# Altium footprint library Connectors.PcbLib: 155 footprints (part 6 of 10)
Each footprint in its own frame and in the unit in brackets; x right, y up, seen from the top. Pads: shape width x height; smd on the part's side, far side on the other; paste and mask are expansions set on the pad; w line width, h text height; cw(c..) or ccw(c..) is an arc to the next point about the centre after c.
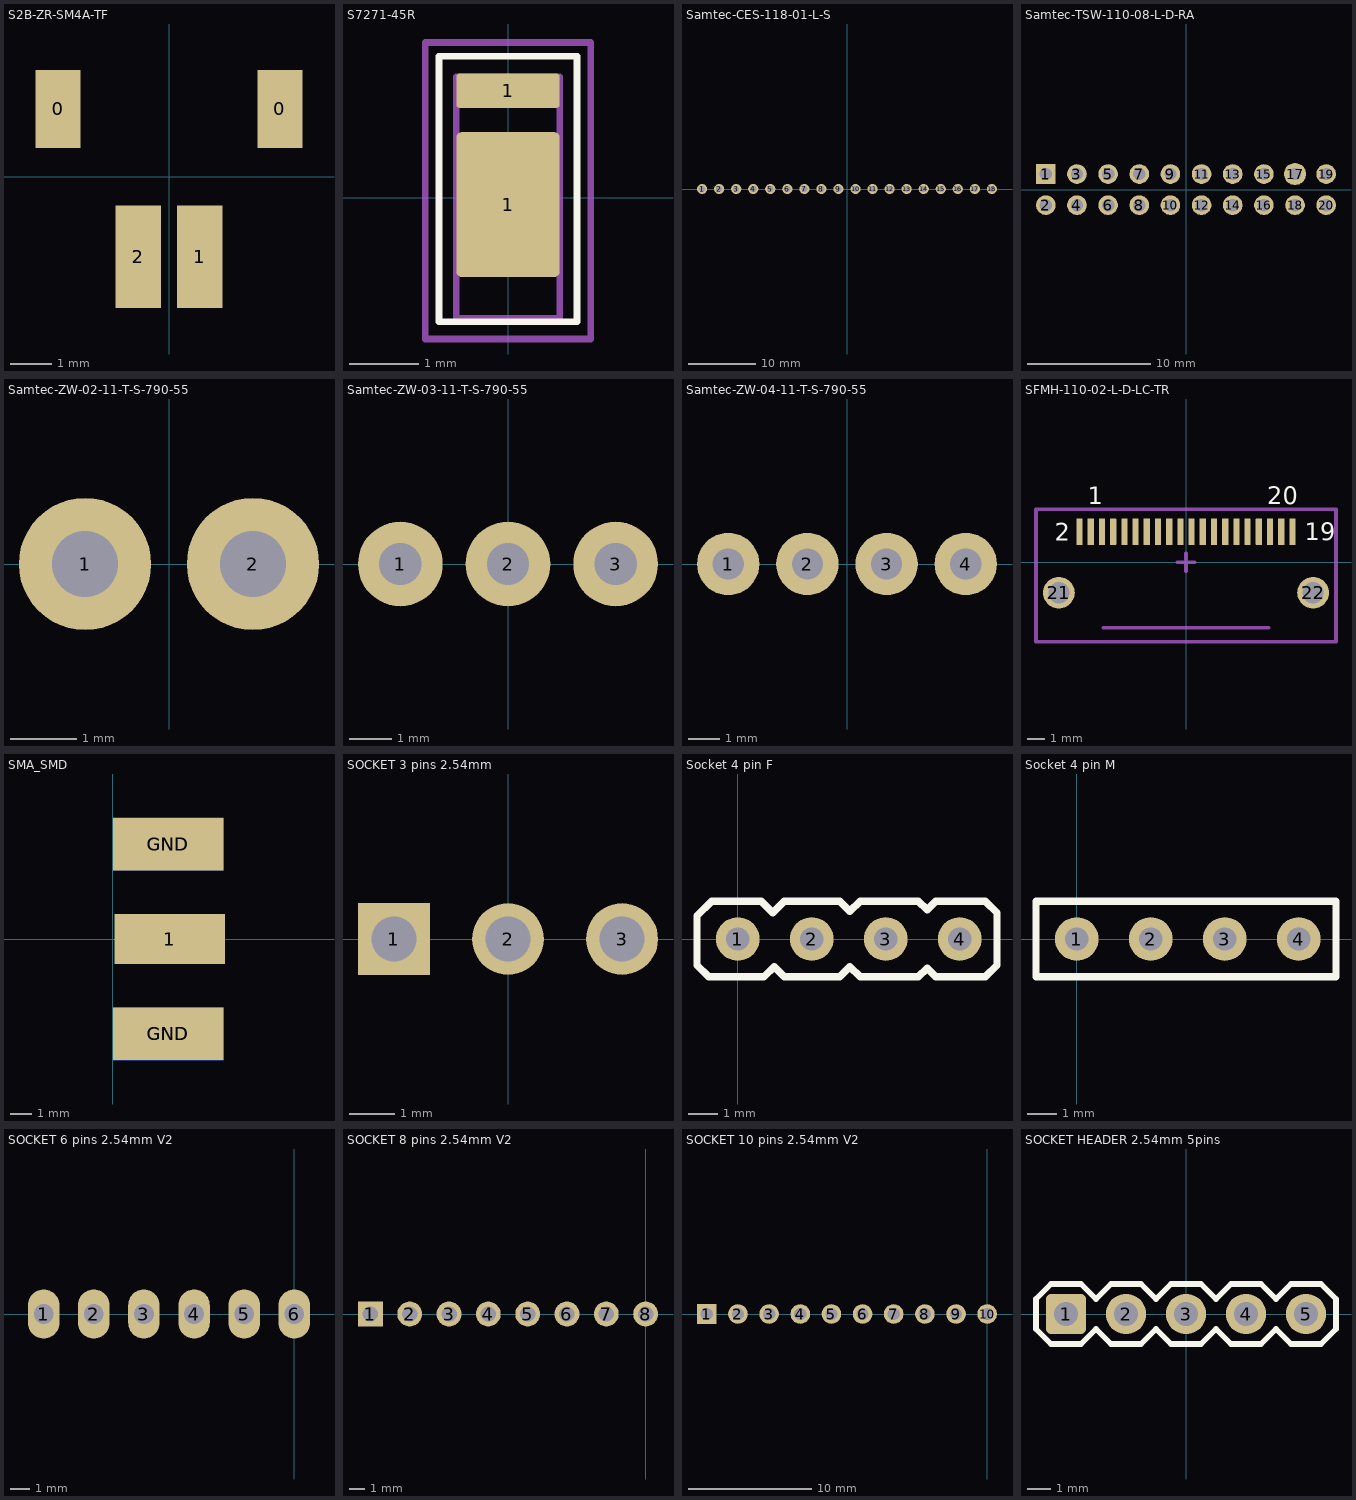
[diagram p5: the footprints below, top view; thin cyan lines are the x and y axes]

## S2B-ZR-SM4A-TF [mm]
pads (4):
  rect 1.1x1.9 smd: 0(-2.7,1.65) 0(2.7,1.65)
  rect 1.1x2.5 smd: 1(0.75,-1.95) 2(-0.75,-1.95)
3D body: height 3.7, standoff 0, extent -3,-2.9 3,3.6

## S7271-45R [mm] "Harwin S7271-45R"
height 2
pads (2):
  rrect10% 1.5x2.1 smd: 1(0,-0.1)
  rrect20% 1.5x0.5 smd: 1(0,1.55)
Top Overlay:
  lines w0.1: -1,-1.8 -1,2.05 1,2.05 1,-1.8 -1,-1.8
Mechanical 13:
  lines w0.1: -0.75,-1.75 -0.75,1.75 0.75,1.75 0.75,-1.75 -0.75,-1.75
Mechanical 15:
  lines w0.1: -0.5,-0.6 0.5,-0.6 ; 0,-1.1 0,-0.1 ; -1.2,-2.05 -1.2,2.25 1.2,2.25 1.2,-2.05 -1.2,-2.05
3D body: height 2, standoff 0, extent -0.75,-1.75 0.75,1.75

## Samtec-CES-118-01-L-S [mil] "Samtec-CES-118-01-L-S"
height 200
pads (18):
  round 60 hole 35.43: 1(-850,0) 2(-750,0) 3(-650,0) 4(-550,0) 5(-450,0) 6(-350,0) 7(-250,0) 8(-150,0) 9(-50,0) 10(50,0) 11(150,0) 12(250,0) 13(350,0) 14(450,0) 15(550,0) 16(650,0) 17(750,0) 18(850,0)
3D body: height 200, standoff -46.88, extent -899.99,-59.99 900.01,60.01

## Samtec-TSW-110-08-L-D-RA [mm] "Samtec-TSW-110-08-L-D-RA"
height 5.08
pads (20):
  rect 1.6x1.6 hole 1: 1(-11.43,1.27)
  round 1.6 hole 1: 2(-11.43,-1.27) 3(-8.89,1.27) 4(-8.89,-1.27) 5(-6.35,1.27) 6(-6.35,-1.27) 7(-3.81,1.27) 8(-3.81,-1.27) 9(-1.27,1.27) 10(-1.27,-1.27) 11(1.27,1.27) 12(1.27,-1.27) 13(3.81,1.27) 14(3.81,-1.27) 15(6.35,1.27) 16(6.35,-1.27) 18(8.89,-1.27) 19(11.43,1.27) 20(11.43,-1.27)
  round 1.8 hole 1: 17(8.89,1.27)
3D body: height 5.08, standoff -3.25, extent -12.7,-2.794 12.7,2.794

## Samtec-ZW-02-11-T-S-790-55 [mm] "Samtec-ZW-02-11-T-S-790-55"
pads (2):
  round 2 hole 1: 1(-1.27,0) 2(1.27,0)
3D body: height 22.21, standoff -1.41, extent -2.54,-1.27 2.54,1.27

## Samtec-ZW-03-11-T-S-790-55 [mm] "Samtec-ZW-03-11-T-S-790-55"
pads (3):
  round 2 hole 1: 1(-2.54,0) 2(0,0) 3(2.54,0)
3D body: height 22.21, standoff -1.41, extent -3.81,-1.27 3.81,1.27

## Samtec-ZW-04-11-T-S-790-55 [mm] "Samtec-ZW-04-11-T-S-790-55"
pads (4):
  round 2 hole 1: 1(-3.81,0) 2(-1.27,0) 3(1.27,0) 4(3.81,0)
3D body: height 22.21, standoff -1.41, extent -5.08,-1.27 5.08,1.27

## SFMH-110-02-L-D-LC-TR [mm] "SFMH-110-02-L-D-LC-TR"
height 3.43
pads (22):
  rrect10% 0.35x1.5 smd: 1(-5.397,1.725) 2(-6.032,1.725) 3(-4.127,1.725) 4(-4.763,1.725) 5(-2.857,1.725) 6(-3.492,1.725) 7(-1.587,1.725) 8(-2.222,1.725) 9(-0.318,1.725) 10(-0.953,1.725) 11(0.953,1.725) 12(0.318,1.725) 13(2.222,1.725) 14(1.587,1.725) 15(3.492,1.725) 16(2.857,1.725) 17(4.763,1.725) 18(4.127,1.725) 19(6.032,1.725) 20(5.397,1.725)
  round 1.8 hole 1.2 unplated: 21(-7.2,-1.725) 22(7.2,-1.725)
Top Overlay:
  text "19" at 6.725,1.25 h1
  text "20" at 4.6,3.3 h1
  text "2" at -7.425,1.225 h1
  text "1" at -5.575,3.275 h1
Mechanical 13:
  lines w0.2: -4.7,-3.725 4.7,-3.725
  text "PCB edge" at -2.05,-3.3 h0.5
Mechanical 15:
  lines w0.2: -0.5,0 0.5,0 ; 0,-0.5 0,0.5 ; -8.5,-4.5 -8.5,3 8.5,3 8.5,-4.5 -8.5,-4.5
3D body: height 3.43, standoff -1.65, extent -7.836,-4 7.786,2.223

## SMA_SMD [mm] "SMA_SMD"
pads (5):
  rect 5.08x2.29 smd: 1(2.625,0)
  rect 5.08x2.415 smd: GND(2.55,-4.375) GND(2.55,4.375)
  rect 5.08x2.415 smd far side: GND(2.55,-4.375) GND(2.55,4.375)
3D body: height 4.33, standoff -3.59, extent -9.55,-4.76 4.72,4.76

## SOCKET 3 pins 2.54mm [mm]
pads (3):
  rect 1.6x1.6 hole 1: 1(-2.54,0)
  round 1.6 hole 1: 2(0,0) 3(2.54,0)
3D body: height 8.38, standoff -2.54, extent -3.81,-1.27 3.81,1.27

## Socket 4 pin F [mm] "Socket 4 pin F"
height 10
pads (4):
  round 1.5 hole 0.8: 1(0,0) 2(2.54,0) 3(5.08,0) 4(7.62,0)
Top Overlay:
  lines w0.254: -1.4,-0.9 -1,-1.3 0.9,-1.3 1.25,-0.95 1.6,-1.3 3.5,-1.3 3.85,-0.95 4.2,-1.3 6.2,-1.3 6.5,-1 6.8,-1.3 8.5,-1.3 8.9,-0.9 8.9,0.9 8.5,1.3 6.8,1.3 6.5,1 6.2,1.3 4.2,1.3 3.85,0.95 3.5,1.3 1.6,1.3 1.2,0.9 0.8,1.3 -0.9,1.3 -1.4,0.8 -1.4,-0.9

## Socket 4 pin M [mm] "Socket 4 pin M"
height 10
pads (4):
  round 1.5 hole 0.8: 1(0,0) 2(2.54,0) 3(5.08,0) 4(7.62,0)
Top Overlay:
  lines w0.254: -1.4,-1.3 8.9,-1.3 8.9,1.3 -1.4,1.3 -1.4,-1.3

## SOCKET 6 pins 2.54mm V2 [mm] "SOCKET 6 pins 2.54mm V2"
pads (6):
  oval 1.6x2.5 hole 1: 1(-12.7,0) 2(-10.16,0) 3(-7.62,0) 4(-5.08,0) 5(-2.54,0) 6(0,0)
3D body: height 8.51, standoff -10.01, extent -14.224,-1.207 1.524,1.207

## SOCKET 8 pins 2.54mm V2 [mm] "SOCKET 8 pins 2.54mm V2"
pads (8):
  rect 1.6x1.6 hole 1: 1(-17.78,0)
  round 1.6 hole 1: 2(-15.24,0) 3(-12.7,0) 4(-10.16,0) 5(-7.62,0) 6(-5.08,0) 7(-2.54,0) 8(0,0)
3D body: height 8.51, standoff -10.01, extent -19.304,-1.207 1.524,1.207

## SOCKET 10 pins 2.54mm V2 [mm] "SOCKET 10 pins 2.54mm V2"
pads (10):
  rect 1.6x1.6 hole 1: 1(-22.86,0)
  round 1.6 hole 1: 2(-20.32,0) 3(-17.78,0) 4(-15.24,0) 5(-12.7,0) 6(-10.16,0) 7(-7.62,0) 8(-5.08,0) 9(-2.54,0) 10(0,0)
3D body: height 8.51, standoff -10.01, extent -24.384,-1.207 1.524,1.207

## SOCKET HEADER 2.54mm 5pins [mm] "SOCKET HEADER 2.54mm 5pins"
pads (5):
  rrect25% 1.7x1.7 hole 1: 1(-5.08,0)
  round 1.7 hole 1: 2(-2.54,0) 3(0,0) 4(2.54,0) 5(5.08,0)
Top Overlay:
  lines w0.254: -6.35,-0.635 -6.35,0.635 -5.715,1.27 -4.445,1.27 -3.81,0.635 -3.175,1.27 -1.905,1.27 -1.27,0.635 -0.635,1.27 0.635,1.27 1.27,0.635 1.905,1.27 3.175,1.27 3.81,0.635 4.445,1.27 5.715,1.27 6.35,0.635 6.35,-0.635 5.715,-1.27 4.445,-1.27 3.81,-0.635 3.175,-1.27 1.905,-1.27 1.27,-0.635 0.635,-1.27 -0.635,-1.27 -1.27,-0.635 -1.905,-1.27 -3.175,-1.27 -3.81,-0.635 -4.445,-1.27 -5.715,-1.27 -6.35,-0.635
3D body: height 9.27, standoff -2.92, extent -6.35,-1.27 6.35,1.27